# Altium footprint library Electronic Devices_LIB.PcbLib: 410 footprints (part 6 of 26)
Each footprint in its own frame and in the unit in brackets; x right, y up, seen from the top. Pads: shape width x height; smd on the part's side, far side on the other; paste and mask are expansions set on the pad; w line width, h text height; cw(c..) or ccw(c..) is an arc to the next point about the centre after c.
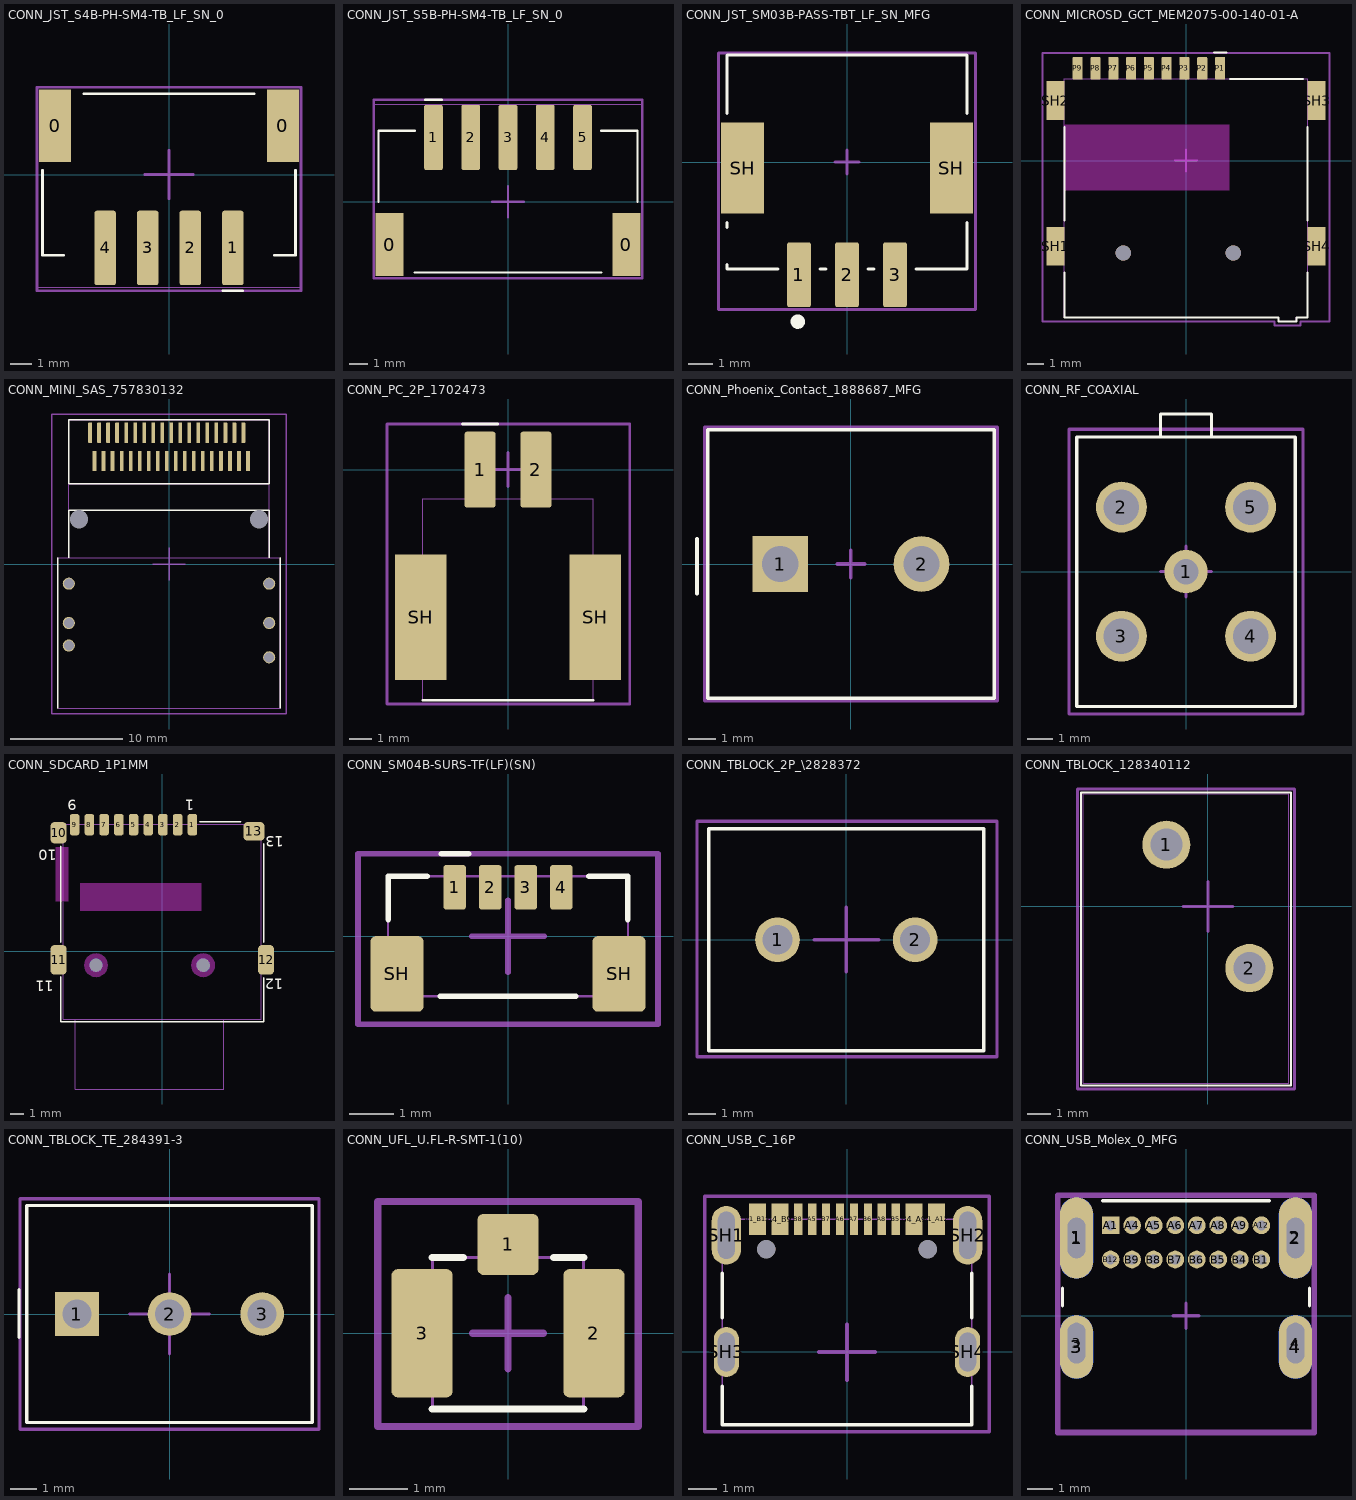
[diagram p5: the footprints below, top view; thin cyan lines are the x and y axes]

## CONN_JST_S4B-PH-SM4-TB_LF_SN_0 [mm] "Connector Header Surface Mount, Right Angle 4 position 0.079\" (2.00mm)"
height 5.51
pads (6):
  rect 1.5x3.4 smd paste+0: 0(-5.35,2.3) 0(5.35,2.3)
  rrect20% 1x3.5 smd paste+0: 1(3,-3.45) 2(1,-3.45) 3(-1,-3.45) 4(-3,-3.45)
Top Overlay:
  lines w0.127: -5.95,0.2 -5.95,-3.8 -4.95,-3.8 ; -4,3.8 4,3.8 ; 2.54,-5.461 3.454,-5.461 ; 4.95,-3.8 5.95,-3.8 5.95,0.2
Top Assembly:
  lines w0.051: -6.2,-5.3 -6.2,4.1 6.2,4.1 6.2,-5.3 -6.2,-5.3
  text ".Designator" at -2.489,-0.288 h0.51
Top Courtyard:
  lines w0.127: -1.143,0 0,0 ; 0,-1.143 0,0 ; 0,1.143 0,0 ; 1.143,0 0,0 ; -6.2,-5.461 -6.2,4.1 6.2,4.1 6.2,-5.461 -6.2,-5.461
3D body "S4B-PH-SM4-TB_LF__SN_.stp": height 5.58, standoff -0.02, extent -5.874,-5.042 6.026,3.825

## CONN_JST_S5B-PH-SM4-TB_LF_SN_0 [mm] "Connector Header Surface Mount, Right Angle 5 position 0.079\" (2.00mm)"
height 5.51
pads (7):
  rect 1.5x3.4 smd paste+0: 0(-6.35,-2.3) 0(6.35,-2.3)
  rrect20% 1x3.5 smd paste+0: 1(-4,3.45) 2(-2,3.45) 3(0,3.45) 4(2,3.45) 5(4,3.45)
Top Overlay:
  lines w0.127: -6.95,0 -6.95,3.8 -5,3.8 ; -5,-3.8 5,-3.8 ; -4.445,5.461 -3.556,5.461 ; 5,3.8 6.95,3.8 6.95,0
Top Assembly:
  lines w0.051: -7.2,-4.1 7.2,-4.1 7.2,5.232 -7.2,5.232 -7.2,-4.1
  text ".Designator" at -2.286,-0.364 h0.51
Top Courtyard:
  lines w0.127: -0.838,0 0,0 ; 0,-0.838 0,0 ; 0,0.838 0,0 ; 0.838,0 0,0 ; -7.2,-4.1 7.2,-4.1 7.2,5.461 -7.2,5.461 -7.2,-4.1
3D body "S5B-PH-SM4-TB_LF__SN_.stp": height 5.58, standoff 0, extent -6.95,-3.55 6.95,5.055

## CONN_JST_SM03B-PASS-TBT_LF_SN_MFG [mm]
pads (5):
  rrect20% 1x2.7 smd: 1(-2,-4.7) 2(0,-4.7) 3(2,-4.7)
  rect 1.8x3.8 smd: SH(-4.35,-0.25) SH(4.35,-0.25)
Top Overlay:
  circle w0.3: c-2.05,-6.65 r0.15
  lines w0.127: -5,-4.275 -5,-4.45 -2.875,-4.45 ; -5,-2.725 -5,-2.525 ; -5,2.025 -5,4.45 5,4.45 5,2.025 ; -1.125,-4.45 -0.875,-4.45 ; 0.875,-4.45 1.125,-4.45 ; 2.875,-4.45 5,-4.45 5,-2.525
Top Assembly:
  text ".Designator" at -2.649,-0.53 h0.51
Top Courtyard:
  lines w0.127: -0.5,0 0.5,0 ; 0,-0.5 0,0.5 ; -5.35,-6.15 -5.35,4.55 5.35,4.55 5.35,-6.15 -5.35,-6.15
3D body "Conn_JST_SM03B-PASS-TBT_LF_SN_eec.STEP": height 0.25, standoff 0, extent -5.35,-6.15 5.35,4.55

## CONN_MICROSD_GCT_MEM2075-00-140-01-A [mm] "0.055\" (1.40mm)"
height 1.4
pads (15):
  rrect20% 0.62x1.4 smd: P1(2.105,5.71) P2(1.005,5.71) P3(-0.095,5.71) P4(-1.195,5.71) P5(-2.295,5.71) P6(-3.395,5.71) P7(-4.495,5.71) P8(-5.595,5.71) P9(-6.695,5.71)
  rect 1.1x2.4 smd: SH1(-8.075,-5.29) SH2(-8.075,3.71) SH3(8.075,3.71) SH4(8.075,-5.29)
  round 0.95 hole 0.95 unplated: ""(-3.875,-5.71) ""(2.925,-5.71)
Top Overlay:
  lines w0.127: -7.525,-6.91 -7.525,-9.69 5.725,-9.69 5.725,-9.94 6.825,-9.94 6.825,-9.69 7.525,-9.69 7.525,-6.91 ; -7.525,-3.71 -7.525,2.09 ; 1.727,6.68 2.489,6.68 ; 2.725,5.06 7.225,5.06 ; 7.525,-3.71 7.525,2.09
Keep-Out Layer:
  region: 2.675,-1.84 -7.525,-1.84 -7.525,2.21 2.675,2.21
Top Assembly:
  lines w0.051: -7.525,-9.69 -7.525,5.06 7.525,5.06 7.525,-9.69 6.825,-9.69 6.825,-9.94 5.725,-9.94 5.725,-9.69 -7.525,-9.69
  text ".Designator" at -2.863,-4.576 h0.51
Top Courtyard:
  lines w0.127: -0.686,0 0,0 ; 0,-0.686 0,0 ; 0,0.686 0,0 ; 0.686,0 0,0 ; -8.875,-9.94 5.475,-9.94 5.475,-10.19 7.075,-10.19 7.075,-9.94 8.875,-9.94 8.875,6.66 -8.875,6.66 -8.875,-9.94
3D body "MEM2075-00-140-01-A.step": height 1.46, standoff -0.59, extent -8.197,-9.94 8.243,5.91

## CONN_MINI_SAS_757830132 [mm] "15.0µin (0.38µm)"
height 8.47
pads (44):
  rrect20% 0.35x1.8 smd: A1(7,9.155) A2(6.2,9.155) A3(5.4,9.155) A4(4.6,9.155) A5(3.8,9.155) A6(3,9.155) A7(2.2,9.155) A8(1.4,9.155) A9(0.6,9.155) A10(-0.2,9.155) A11(-1,9.155) A12(-1.8,9.155) A13(-2.6,9.155) A14(-3.4,9.155) A15(-4.2,9.155) A16(-5,9.155) A17(-5.8,9.155) A18(-6.6,9.155) B1(6.6,11.665) B2(5.8,11.665) B3(5,11.665) B4(4.2,11.665) B5(3.4,11.665) B6(2.6,11.665) B7(1.8,11.665) B8(1,11.665) B9(0.2,11.665) B10(-0.6,11.665) B11(-1.4,11.665) B12(-2.2,11.665) B13(-3,11.665) B14(-3.8,11.665) B15(-4.6,11.665) B16(-5.4,11.665) B17(-6.2,11.665) B18(-7,11.665)
  round 0.8 hole 1.6 unplated: MH1(8,3.975) MH2(-8,3.975)
  round 1.08 hole 0.88: SH1(-8.9,-1.745) SH2(-8.9,-5.245) SH3(-8.9,-7.245) SH4(8.9,-8.29) SH5(8.9,-5.245) SH6(8.9,-1.745)
Top Overlay:
  lines w0.127: -9.9,-12.825 -9.9,0.575 ; -8.9,0.575 -8.9,4.775 8.9,4.775 8.9,0.575 ; 9.9,-12.825 9.9,0.575 ; -8.9,7.125 8.9,7.125 ; -8.9,7.125 -8.9,12.825 8.9,12.825 8.9,7.125 ; -8.9,7.125 8.9,7.125
Top Assembly:
  lines w0.051: -8.9,4.775 8.9,4.775 ; -8.9,7.125 8.9,7.125 ; -9.9,-12.825 9.9,-12.825 9.9,0.575 -9.9,0.575 -9.9,-12.825 ; -8.9,0.575 8.9,0.575 8.9,12.825 -8.9,12.825 -8.9,0.575
  text ".Designator" at -2.388,-0.339 h0.51
Top Courtyard:
  lines w0.127: -1.422,0 0,0 ; 0,-1.422 0,0 ; 0,1.422 0,0 ; 1.422,0 0,0 ; -10.4,-13.325 10.4,-13.325 10.4,13.325 -10.4,13.325 -10.4,-13.325
3D body "75783-0132.stp": height 15.16, standoff -7.84, extent -9.226,-13.041 9.124,12.929

## CONN_PC_2P_1702473 [mm] "0.098\" (2.50mm)"
height 5
pads (4):
  rrect20% 1.4x3.4 smd: 1(-1.25,0) 2(1.25,0)
  rect 2.3x5.6 smd: SH(-3.9,-6.6) SH(3.9,-6.6)
Top Overlay:
  lines w0.127: -3.8,-10.3 3.8,-10.3 ; -2.032,2.032 -0.457,2.032
Top Assembly:
  lines w0.051: -3.8,-10.3 3.8,-10.3 3.8,-1.3 -3.8,-1.3 -3.8,-10.3
  text ".Designator" at -2.54,-1.71 h0.51
Top Courtyard:
  lines w0.127: -0.762,0 0,0 ; 0,-0.762 0,0 ; 0,0.762 0,0 ; 0.762,0 0,0 ; -5.41,-10.465 5.436,-10.465 5.436,2.032 -5.41,2.032 -5.41,-10.465
3D body "1702473.stp": height 5.12, standoff 0.12, extent -4.7,-10.21 4.7,0.79

## CONN_Phoenix_Contact_1888687_MFG [mm] "Terminal Block Horizontal with Board 0.200\" (5.08mm) Through Hole"
height 9.5
pads (2):
  rect 2x2 hole 1.3: 1(-2.54,0)
  round 2 hole 1.3: 2(2.54,0)
Top Overlay:
  lines w0.127: -5.537,-1.067 -5.537,0.914 ; -5.155,-4.825 -5.155,4.825 5.155,4.825 5.155,-4.825 -5.155,-4.825
Top Assembly:
  lines w0.051: -5.255,-4.925 -5.255,4.925 5.255,4.925 5.255,-4.925 -5.255,-4.925
  text ".Designator" at -2.311,-0.11 h0.51
Top Courtyard:
  lines w0.127: -0.5,0 0.5,0 ; 0,-0.5 0,0.5 ; -5.255,-4.925 -5.255,4.925 5.255,4.925 5.255,-4.925 -5.255,-4.925
3D body "Conn_Phoenix_Contact_1888687_eec.STEP": height 0.25, standoff 0, extent -5.255,-4.925 5.255,4.925

## CONN_RF_COAXIAL [mm]
height 16.45
pads (5):
  round 1.7 hole 1: 1(0,0)
  round 2 hole 1.4: 2(-2.54,2.54) 3(-2.54,-2.54) 4(2.54,-2.54) 5(2.54,2.54)
Top Overlay:
  lines w0.127: -1,5.3 -1,6.2 1,6.2 1,5.3 ; -4.3,-5.3 4.3,-5.3 4.3,5.3 -4.3,5.3 -4.3,-5.3
Top Assembly:
  text ".Designator" at -2.649,-0.18 h0.51
Top Courtyard:
  lines w0.127: -1,0 0,0 ; 0,-1 0,0 ; 0,1 0,0 ; 1,0 0,0 ; -4.6,-5.6 4.6,-5.6 4.6,5.6 -4.6,5.6 -4.6,-5.6
3D body "59s10h-400xx-z_c00_shrink.stp": height 12.4, standoff -4.05, extent -4.25,-4.25 4.25,6.25

## CONN_SDCARD_1P1MM [mil] "CONN_SDCARD_1P1MM"
pads (15):
  rrect50% 28x63 smd: 1(88.58,373.03) 2(45.28,373.03) 3(1.97,373.03) 4(-41.34,373.03) 5(-84.65,373.03) 6(-127.95,373.03) 7(-171.26,373.03) 8(-214.57,373.03) 9(-257.87,373.03)
  rrect50% 47x63 smd: 10(-305.12,349.41)
  rrect50% 47x87 smd: 11(-305.12,-24.6) 12(305.12,-24.6)
  rrect50% 63x55 smd: 13(269.69,353.35)
  round 10 hole 39 unplated: ""(-194.88,-40.35) ""(120.08,-40.35)
Bottom Layer:
  region: 139.96,-40.35 138.45,-47.96 134.14,-54.41 127.69,-58.72 120.08,-60.24 112.47,-58.72 110.31,-57.28 106.02,-54.41 101.71,-47.96 100.2,-40.35 101.71,-32.74 106.02,-26.29 110.31,-23.43 112.47,-21.98 120.08,-20.47 127.69,-21.98 134.14,-26.29 138.45,-32.74
Top Overlay:
  lines w5: -298.34,-75.11 -298.34,-206.8 298.34,-206.8 298.34,-77.1 ; -298.34,26.74 -298.34,309.58 ; 109.75,382 229.75,382 ; 298.34,27.52 298.34,316.84
  text "13" at 357,339 h31
  text "12" at 356,-80 h31
  text "11" at -319,-86 h31
  text "10" at -311,300 h31
  text "1" at 94,446 h31
  text "9" at -251,447 h31
Keep-Out Layer:
  region: -313.98,147.64 -276.57,147.64 -276.57,307.09 -313.98,307.09
  region: -241.14,120.08 -241.14,200.79 115.16,200.79 115.16,120.08
Top Assembly:
  lines w0.01: -291.34,-199.8 -291.34,375 291.34,375 291.34,-199.8 -291.34,-199.8
  lines w1: -255.91,-199.8 -255.91,-404.53 181.1,-404.53 181.1,-199.8
  text ".Designator" at -83,66.66 h20
Multi-Layer keep-out:
  region: 154.88,-40.35 153.69,-49.36 150.22,-57.75 144.69,-64.96 137.48,-70.49 129.09,-73.97 120.08,-75.15 111.07,-73.97 102.68,-70.49 95.47,-64.96 89.94,-57.75 86.47,-49.36 85.28,-40.35 86.47,-31.35 89.94,-22.95 95.47,-15.75 102.68,-10.22 111.07,-6.74 120.08,-5.55 129.09,-6.74 137.48,-10.22 144.69,-15.75 150.22,-22.95 153.69,-31.35
  region: -160.08,-40.35 -161.27,-49.36 -164.74,-57.75 -170.27,-64.96 -177.48,-70.49 -185.88,-73.97 -194.88,-75.15 -203.89,-73.97 -212.28,-70.49 -219.49,-64.96 -225.02,-57.75 -228.5,-49.36 -229.68,-40.35 -228.5,-31.35 -225.02,-22.95 -219.49,-15.75 -212.28,-10.22 -203.89,-6.74 -194.88,-5.55 -185.88,-6.74 -177.48,-10.22 -170.27,-15.75 -164.74,-22.95 -161.27,-31.35

## CONN_SM04B-SURS-TF(LF)(SN) [mm] ", Right Angle 4 position 0.031\" (0.80mm)"
height 1.75
pads (6):
  rrect20% 0.5x1 smd: 1(-1.2,1.1) 2(-0.4,1.1) 3(0.4,1.1) 4(1.2,1.1)
  rrect20% 1.2x1.7 smd: SH(-2.5,-0.85) SH(2.5,-0.85)
Top Overlay:
  lines w0.127: -2.7,0.375 -2.7,1.35 -1.825,1.35 ; -1.525,-1.35 1.525,-1.35 ; -1.499,1.854 -0.889,1.854 ; 1.825,1.35 2.7,1.35 2.7,0.375
Top Assembly:
  lines w0.051: -2.7,-1.35 2.7,-1.35 2.7,1.35 -2.7,1.35 -2.7,-1.35
  text ".Designator" at -2.388,-0.212 h0.51
Top Courtyard:
  lines w0.127: -0.813,0 0,0 ; -0.5,0 0.5,0 ; 0,-0.813 0,0 ; 0,-0.5 0,0.5 ; 0,0.813 0,0 ; 0.813,0 0,0 ; -3.378,-1.981 3.378,-1.981 3.378,1.854 -3.378,1.854 -3.378,-1.981
3D body "Conn_JST_SM04B-SURS-TF_LF_SN_eec.STEP": height 0.25, standoff 0, extent -3.2,-1.8 3.2,1.7

## CONN_TBLOCK_2P_\2828372 [mm]
pads (2):
  round 1.65 hole 1.1: 1(-2.54,0) 2(2.54,0)
Top Overlay:
  lines w0.127: -5.08,-4.1 5.08,-4.1 5.08,4.1 -5.08,4.1 -5.08,-4.1
Top Assembly:
  lines w0.051: -5.08,-4.1 -5.08,4.1 ; -5.08,-4.1 5.08,-4.1 5.08,4.1 -5.08,4.1 ; -5.08,-4.1 -5.08,4.1
  text ".Designator" at -2.388,-0.11 h0.51
Top Courtyard:
  lines w0.127: -1.194,0 0,0 ; 0,-1.194 0,0 ; 0,1.194 0,0 ; 1.194,0 0,0 ; -5.512,-4.318 5.563,-4.318 5.563,4.369 -5.512,4.369 -5.512,-4.318
3D body "282837-2.stp": height 10.1, standoff -3.4, extent -5.029,-4.089 5.731,4.111

## CONN_TBLOCK_128340112 [mm] "Pitch 3.5mm"
pads (2):
  round 2.025 hole 1.35: 1(-1.75,2.6) 2(1.75,-2.6)
Top Overlay:
  lines w0.1: -5.35,-7.55 3.5,-7.55 3.5,4.8 -5.35,4.8 -5.35,-7.55
Top Assembly:
  lines w0.051: -5.25,-7.45 3.4,-7.45 3.4,4.75 -5.25,4.75 -5.25,-7.45
  text ".Designator" at -3.899,-0.38 h0.51
Top Courtyard:
  lines w0.127: -1.05,0 0,0 ; 0,-1.05 0,0 ; 0,1.05 0,0 ; 1.05,0 0,0 ; -5.5,-7.7 3.65,-7.7 3.65,4.95 -5.5,4.95 -5.5,-7.7
3D body "1-2834011-2.stp": height 12.79, standoff -3.64, extent -5.17,-7.35 3.33,4.65

## CONN_TBLOCK_TE_284391-3 [mm]
pads (3):
  rect 1.65x1.65 hole 1.1: 1(-3.5,0)
  round 1.65 hole 1.1: 2(0,0) 3(3.5,0)
Top Overlay:
  lines w0.127: -5.69,-0.889 -5.69,0.914 ; -5.4,-4.1 5.4,-4.1 5.4,4.1 -5.4,4.1 -5.4,-4.1
Top Assembly:
  lines w0.051: -5.4,-4.1 5.4,-4.1 5.4,4.1 -5.4,4.1 -5.4,-4.1
  text ".Designator" at -2.489,-0.186 h0.51
Top Courtyard:
  lines w0.127: -1.499,0 0,0 ; 0,-1.499 0,0 ; 0,1.499 0,0 ; 1.499,0 0,0
Mechanical 15:
  lines w0.127: -5.65,-4.35 5.65,-4.35 5.65,4.35 -5.65,4.35 -5.65,-4.35
3D body "284391-3--3DModel-STEP-1.STEP": height 12.61, standoff -3.49, extent -5.703,-4.064 5.297,4.136

## CONN_UFL_U.FL-R-SMT-1(10) [mm]
pads (3):
  rrect20% 1.05x1.05 smd: 1(0,1.525)
  rrect20% 1.05x2.2 smd: 2(1.475,0) 3(-1.475,0)
Top Overlay:
  lines w0.127: -1.3,-1.3 1.3,-1.3 ; -1.3,1.3 -0.77,1.3 ; 0.788,1.3 1.3,1.3
Top Assembly:
  lines w0.051: -1.3,-1.3 1.3,-1.3 1.3,1.3 -1.3,1.3 -1.3,-1.3
  text ".Designator" at -2.464,0.017 h0.51
Top Courtyard:
  lines w0.127: -0.61,0 0,0 ; 0,-0.61 0,0 ; 0,0.61 0,0 ; 0.61,0 0,0 ; -2.235,-1.6 -2.235,2.261 2.235,2.261 2.235,-1.6 -2.235,-1.6
3D body "U.FL-R-SMT-1_10_.stp": height 1.25, standoff 0, extent -1.5,-1.5 1.5,1.6

## CONN_USB_C_16P [mm] "SMD 16P"
height 3.26
pads (18):
  rect 0.6x1.14 smd: A1_B12(-3.2,4.75) A4_B9(-2.4,4.75) B1_A12(3.2,4.75) B4_A9(2.4,4.75)
  rect 0.3x1.14 smd: A5(-1.25,4.75) A6(-0.25,4.75) A7(0.25,4.75) A8(1.25,4.75) B5(1.75,4.75) B6(0.75,4.75) B7(-0.75,4.75) B8(-1.75,4.75)
  oval 1.05x2.1 hole 0.6 slot 1.7 at 90 deg: SH1(-4.32,4.18) SH2(4.32,4.18)
  oval 0.9x1.8 hole 0.6 slot 1.4 at 90 deg: SH3(-4.32,0) SH4(4.32,0)
  round 0.65 hole 0.65 unplated: ""(-2.89,3.68) ""(2.89,3.68)
Top Overlay:
  lines w0.127: -4.47,-1.22 -4.47,-2.6 4.47,-2.6 4.47,-1.22 ; -4.47,1.22 -4.47,2.81 ; 4.47,1.22 4.47,2.81
Top Assembly:
  lines w0.051: -4.47,-2.6 4.47,-2.6 4.47,4.75 -4.47,4.75 -4.47,-2.6
  text ".Designator" at -2.311,0.449 h0.51
Top Courtyard:
  lines w0.127: -1.016,0 -0.025,0 ; 0,-1.016 0,-0.025 ; 0,0 0,0.991 ; 0.025,0 1.016,0 ; -5.095,-2.85 5.095,-2.85 5.095,5.57 -5.095,5.57 -5.095,-2.85
3D body "step_temp.STEP": height 3.23, standoff -0.94, extent -4.47,-2.571 4.47,5.029

## CONN_USB_Molex_0_MFG [mm] "THT USB"
height 2.56
pads (28):
  rrect100% 0.7x1.6 hole 1.6 slot 0.7 at 0 deg paste-1000 mask+0: 1(-4.32,3.065) 2(4.32,3.065) 3(-4.32,-1.085) 4(4.32,-1.085)
  rrect100% 1.3x3.2 smd paste-1000: 1(-4.32,3.065) 2(4.32,3.065)
  rrect100% 1.3x3.2 smd far side paste-1000 mask+0: 1(-4.32,3.065) 2(4.32,3.065)
  rrect100% 1.3x2.5 smd paste-1000: 3(-4.32,-1.235) 4(4.32,-1.235)
  rrect100% 1.3x2.5 smd far side paste-1000 mask+0: 3(-4.32,-1.235) 4(4.32,-1.235)
  rect 0.7x0.7 hole 0.4 paste-1000 mask+0.076: A1(-2.975,3.565)
  round 0.7 hole 0.4 paste-1000 mask+0.076: A4(-2.125,3.565) A5(-1.275,3.565) A7(0.425,3.565) A8(1.275,3.565) A9(2.125,3.565) A12(2.975,3.565) B1(2.975,2.215) B4(2.125,2.215) B5(1.275,2.215) B6(0.425,2.215) B7(-0.425,2.215) B8(-1.275,2.215) B9(-2.125,2.215)
  round 0.7 hole 0.4 mask+0.076: A6(-0.425,3.565)
  round 0.7 hole 0.4 paste-1000: B12(-2.975,2.215)
Top Overlay:
  lines w0.127: -4.87,0.39 -4.87,1.09 ; -3.295,4.535 3.295,4.535 ; 4.87,0.39 4.87,1.09
Top Assembly:
  lines w0.051: -4.978,-4.521 -4.978,4.674 4.978,4.674 4.978,-4.521 -4.978,-4.521
  text ".Designator" at -2.718,-0.009 h0.51
Top Courtyard:
  lines w0.127: -0.5,0 0.5,0 ; 0,-0.5 0,0.5 ; -5.07,-4.635 5.07,-4.635 5.07,4.765 -5.07,4.765 -5.07,-4.635
Bottom Component Center (Mech10):
  lines w0.2: -5.07,-4.635 5.07,-4.635 5.07,4.765 -5.07,4.765 -5.07,-4.635
3D body "Conn_Molex_2137160001_eec.STEP": height 0.25, standoff 0, extent -5.07,-4.635 5.07,4.765